# Altium footprint library smd-ipc.PCBLIB: 363 footprints (part 11 of 27)
Each footprint in its own frame and in the unit in brackets; x right, y up, seen from the top. Pads: shape width x height; smd on the part's side, far side on the other; paste and mask are expansions set on the pad; w line width, h text height; cw(c..) or ccw(c..) is an arc to the next point about the centre after c.
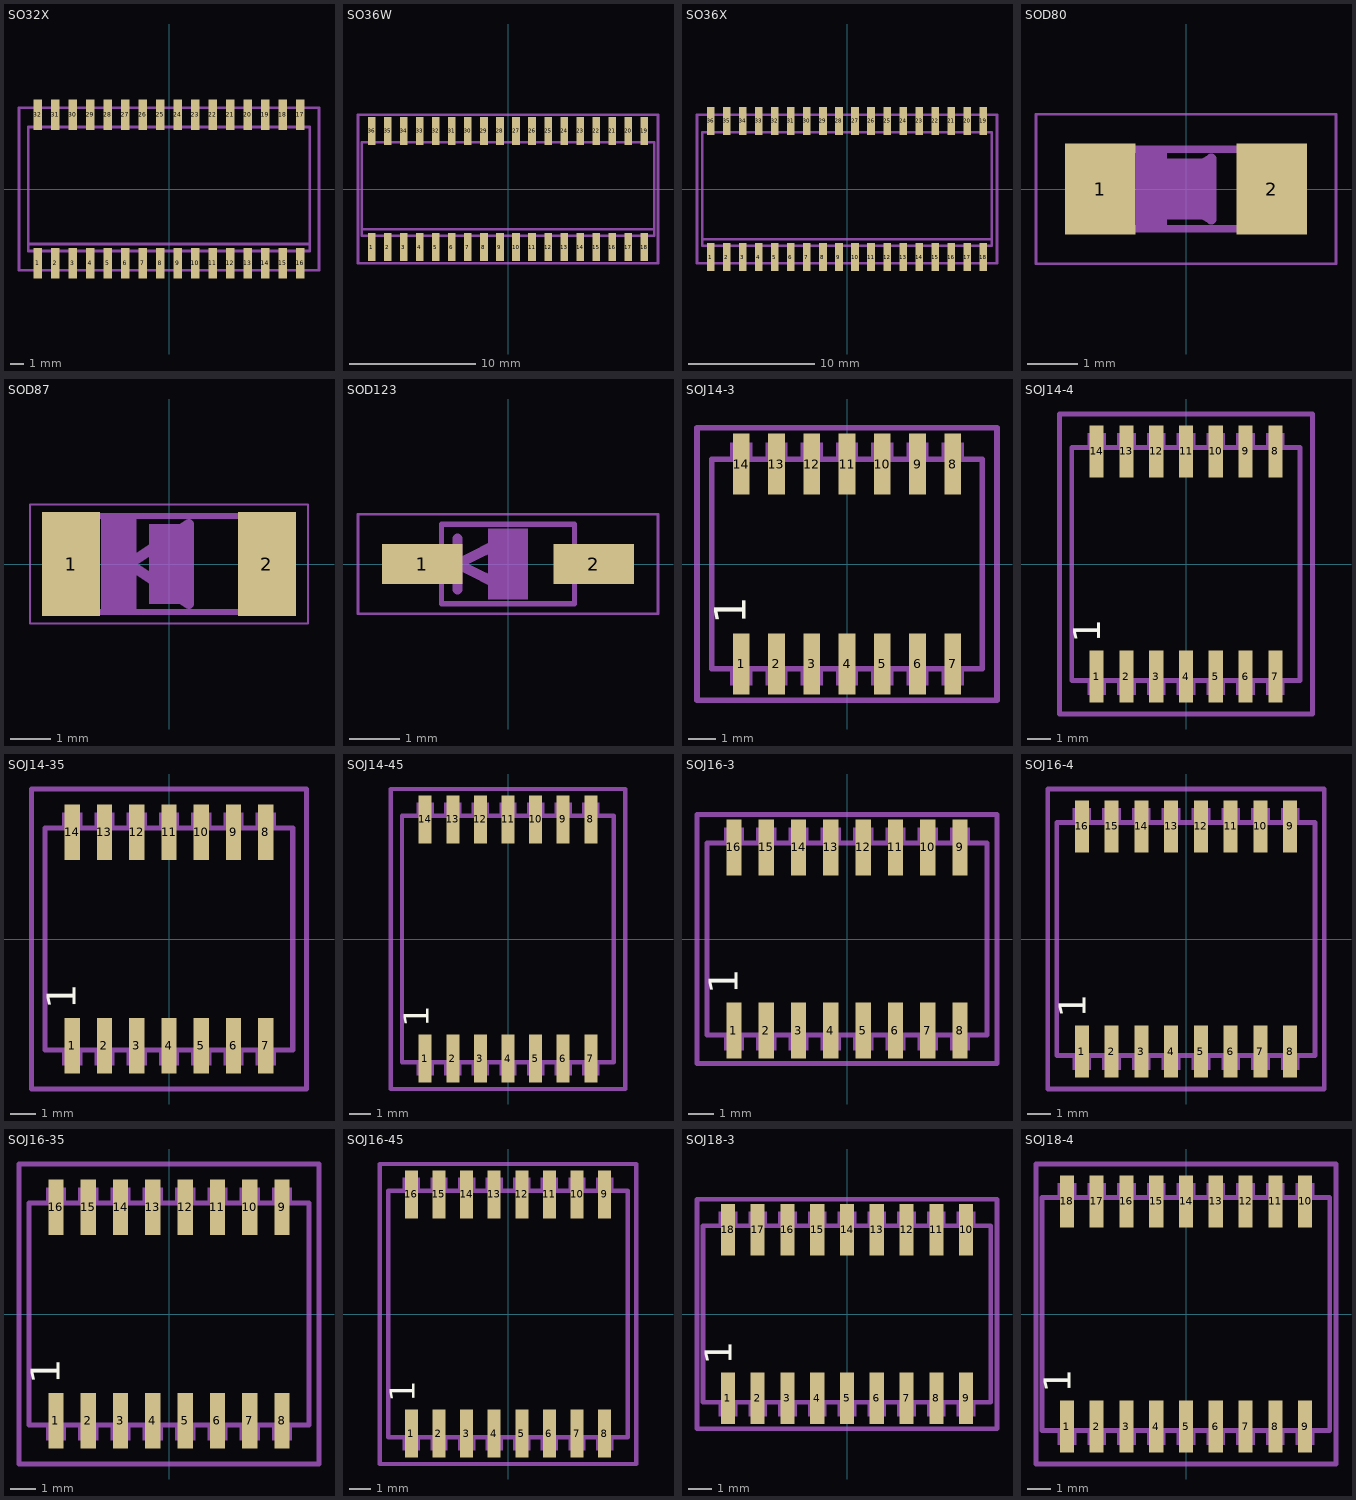
[diagram p10: the footprints below, top view; thin cyan lines are the x and y axes]

## SO32X [mm]
pads (32):
  rect 0.6x2.2 smd: 1(-9.525,-5.4) 2(-8.255,-5.4) 3(-6.985,-5.4) 4(-5.715,-5.4) 5(-4.445,-5.4) 6(-3.175,-5.4) 7(-1.905,-5.4) 8(-0.635,-5.4) 9(0.635,-5.4) 10(1.905,-5.4) 11(3.175,-5.4) 12(4.445,-5.4) 13(5.715,-5.4) 14(6.985,-5.4) 15(8.255,-5.4) 16(9.525,-5.4) 17(9.525,5.4) 18(8.255,5.4) 19(6.985,5.4) 20(5.715,5.4) 21(4.445,5.4) 22(3.175,5.4) 23(1.905,5.4) 24(0.635,5.4) 25(-0.635,5.4) 26(-1.905,5.4) 27(-3.175,5.4) 28(-4.445,5.4) 29(-5.715,5.4) 30(-6.985,5.4) 31(-8.255,5.4) 32(-9.525,5.4)
Mechanical 16:
  rectangle: -9.77,-6.12 -9.28,-4.6
  rectangle: -8.5,-6.12 -8.01,-4.6
  rectangle: -7.23,-6.12 -6.74,-4.6
  rectangle: -5.96,-6.12 -5.47,-4.6
  rectangle: -4.69,-6.12 -4.2,-4.6
  rectangle: -3.42,-6.12 -2.93,-4.6
  rectangle: -2.15,-6.12 -1.66,-4.6
  rectangle: -0.88,-6.12 -0.39,-4.6
  rectangle: 0.39,-6.12 0.88,-4.6
  rectangle: 1.66,-6.12 2.15,-4.6
  rectangle: 2.93,-6.12 3.42,-4.6
  rectangle: 4.2,-6.12 4.69,-4.6
  rectangle: 5.47,-6.12 5.96,-4.6
  rectangle: 6.74,-6.12 7.23,-4.6
  rectangle: 8.01,-6.12 8.5,-4.6
  rectangle: 9.28,-6.12 9.77,-4.6
  rectangle: 9.28,4.6 9.77,6.12
  rectangle: 8.01,4.6 8.5,6.12
  rectangle: 6.74,4.6 7.23,6.12
  rectangle: 5.47,4.6 5.96,6.12
  rectangle: 4.2,4.6 4.69,6.12
  rectangle: 2.93,4.6 3.42,6.12
  rectangle: 1.66,4.6 2.15,6.12
  rectangle: 0.39,4.6 0.88,6.12
  rectangle: -0.88,4.6 -0.39,6.12
  rectangle: -2.15,4.6 -1.66,6.12
  rectangle: -3.42,4.6 -2.93,6.12
  rectangle: -4.69,4.6 -4.2,6.12
  rectangle: -5.96,4.6 -5.47,6.12
  rectangle: -7.23,4.6 -6.74,6.12
  rectangle: -8.5,4.6 -8.01,6.12
  rectangle: -9.77,4.6 -9.28,6.12
  lines w0.203: -10.22,-4 -10.22,-4.5 10.22,-4.5 10.22,-4 ; -10.22,-4 -10.22,4.5 10.22,4.5 10.22,-4 ; -10.22,-4 10.22,-4
Mechanical 27:
  lines w0.2: -10.895,-5.9 10.895,-5.9 10.895,5.9 -10.895,5.9 -10.895,-5.9

## SO36W [mm]
pads (36):
  rect 0.6x2.2 smd: 1(-10.795,-4.6) 2(-9.525,-4.6) 3(-8.255,-4.6) 4(-6.985,-4.6) 5(-5.715,-4.6) 6(-4.445,-4.6) 7(-3.175,-4.6) 8(-1.905,-4.6) 9(-0.635,-4.6) 10(0.635,-4.6) 11(1.905,-4.6) 12(3.175,-4.6) 13(4.445,-4.6) 14(5.715,-4.6) 15(6.985,-4.6) 16(8.255,-4.6) 17(9.525,-4.6) 18(10.795,-4.6) 19(10.795,4.6) 20(9.525,4.6) 21(8.255,4.6) 22(6.985,4.6) 23(5.715,4.6) 24(4.445,4.6) 25(3.175,4.6) 26(1.905,4.6) 27(0.635,4.6) 28(-0.635,4.6) 29(-1.905,4.6) 30(-3.175,4.6) 31(-4.445,4.6) 32(-5.715,4.6) 33(-6.985,4.6) 34(-8.255,4.6) 35(-9.525,4.6) 36(-10.795,4.6)
Mechanical 16:
  rectangle: -11.04,-5.32 -10.55,-3.8
  rectangle: -9.77,-5.32 -9.28,-3.8
  rectangle: -8.5,-5.32 -8.01,-3.8
  rectangle: -7.23,-5.32 -6.74,-3.8
  rectangle: -5.96,-5.32 -5.47,-3.8
  rectangle: -4.69,-5.32 -4.2,-3.8
  rectangle: -3.42,-5.32 -2.93,-3.8
  rectangle: -2.15,-5.32 -1.66,-3.8
  rectangle: -0.88,-5.32 -0.39,-3.8
  rectangle: 0.39,-5.32 0.88,-3.8
  rectangle: 1.66,-5.32 2.15,-3.8
  rectangle: 2.93,-5.32 3.42,-3.8
  rectangle: 4.2,-5.32 4.69,-3.8
  rectangle: 5.47,-5.32 5.96,-3.8
  rectangle: 6.74,-5.32 7.23,-3.8
  rectangle: 8.01,-5.32 8.5,-3.8
  rectangle: 9.28,-5.32 9.77,-3.8
  rectangle: 10.55,-5.32 11.04,-3.8
  rectangle: 10.55,3.8 11.04,5.32
  rectangle: 9.28,3.8 9.77,5.32
  rectangle: 8.01,3.8 8.5,5.32
  rectangle: 6.74,3.8 7.23,5.32
  rectangle: 5.47,3.8 5.96,5.32
  rectangle: 4.2,3.8 4.69,5.32
  rectangle: 2.93,3.8 3.42,5.32
  rectangle: 1.66,3.8 2.15,5.32
  rectangle: 0.39,3.8 0.88,5.32
  rectangle: -0.88,3.8 -0.39,5.32
  rectangle: -2.15,3.8 -1.66,5.32
  rectangle: -3.42,3.8 -2.93,5.32
  rectangle: -4.69,3.8 -4.2,5.32
  rectangle: -5.96,3.8 -5.47,5.32
  rectangle: -7.23,3.8 -6.74,5.32
  rectangle: -8.5,3.8 -8.01,5.32
  rectangle: -9.77,3.8 -9.28,5.32
  rectangle: -11.04,3.8 -10.55,5.32
  lines w0.203: -11.59,-3.2 -11.59,-3.7 11.59,-3.7 11.59,-3.2 ; -11.59,-3.2 -11.59,3.7 11.59,3.7 11.59,-3.2 ; -11.59,-3.2 11.59,-3.2
Mechanical 27:
  lines w0.2: -11.895,-5.9 11.895,-5.9 11.895,5.9 -11.895,5.9 -11.895,-5.9

## SO36X [mm]
pads (36):
  rect 0.6x2.2 smd: 1(-10.795,-5.4) 2(-9.525,-5.4) 3(-8.255,-5.4) 4(-6.985,-5.4) 5(-5.715,-5.4) 6(-4.445,-5.4) 7(-3.175,-5.4) 8(-1.905,-5.4) 9(-0.635,-5.4) 10(0.635,-5.4) 11(1.905,-5.4) 12(3.175,-5.4) 13(4.445,-5.4) 14(5.715,-5.4) 15(6.985,-5.4) 16(8.255,-5.4) 17(9.525,-5.4) 18(10.795,-5.4) 19(10.795,5.4) 20(9.525,5.4) 21(8.255,5.4) 22(6.985,5.4) 23(5.715,5.4) 24(4.445,5.4) 25(3.175,5.4) 26(1.905,5.4) 27(0.635,5.4) 28(-0.635,5.4) 29(-1.905,5.4) 30(-3.175,5.4) 31(-4.445,5.4) 32(-5.715,5.4) 33(-6.985,5.4) 34(-8.255,5.4) 35(-9.525,5.4) 36(-10.795,5.4)
Mechanical 16:
  rectangle: -11.04,-6.12 -10.55,-4.6
  rectangle: -9.77,-6.12 -9.28,-4.6
  rectangle: -8.5,-6.12 -8.01,-4.6
  rectangle: -7.23,-6.12 -6.74,-4.6
  rectangle: -5.96,-6.12 -5.47,-4.6
  rectangle: -4.69,-6.12 -4.2,-4.6
  rectangle: -3.42,-6.12 -2.93,-4.6
  rectangle: -2.15,-6.12 -1.66,-4.6
  rectangle: -0.88,-6.12 -0.39,-4.6
  rectangle: 0.39,-6.12 0.88,-4.6
  rectangle: 1.66,-6.12 2.15,-4.6
  rectangle: 2.93,-6.12 3.42,-4.6
  rectangle: 4.2,-6.12 4.69,-4.6
  rectangle: 5.47,-6.12 5.96,-4.6
  rectangle: 6.74,-6.12 7.23,-4.6
  rectangle: 8.01,-6.12 8.5,-4.6
  rectangle: 9.28,-6.12 9.77,-4.6
  rectangle: 10.55,-6.12 11.04,-4.6
  rectangle: 10.55,4.6 11.04,6.12
  rectangle: 9.28,4.6 9.77,6.12
  rectangle: 8.01,4.6 8.5,6.12
  rectangle: 6.74,4.6 7.23,6.12
  rectangle: 5.47,4.6 5.96,6.12
  rectangle: 4.2,4.6 4.69,6.12
  rectangle: 2.93,4.6 3.42,6.12
  rectangle: 1.66,4.6 2.15,6.12
  rectangle: 0.39,4.6 0.88,6.12
  rectangle: -0.88,4.6 -0.39,6.12
  rectangle: -2.15,4.6 -1.66,6.12
  rectangle: -3.42,4.6 -2.93,6.12
  rectangle: -4.69,4.6 -4.2,6.12
  rectangle: -5.96,4.6 -5.47,6.12
  rectangle: -7.23,4.6 -6.74,6.12
  rectangle: -8.5,4.6 -8.01,6.12
  rectangle: -9.77,4.6 -9.28,6.12
  rectangle: -11.04,4.6 -10.55,6.12
  lines w0.203: -11.49,-4 -11.49,-4.5 11.49,-4.5 11.49,-4 ; -11.49,-4 -11.49,4.5 11.49,4.5 11.49,-4 ; -11.49,-4 11.49,-4
Mechanical 27:
  lines w0.2: -11.895,-5.9 11.895,-5.9 11.895,5.9 -11.895,5.9 -11.895,-5.9

## SOD80 [mm]
pads (2):
  rect 1.4x1.8 smd: 1(-1.7,0) 2(1.7,0)
Mechanical 6:
  rectangle: -0.4,-0.6 0.4,0.6
Mechanical 16:
  rectangle: -1.854,-0.864 -1.295,0.864
  rectangle: 1.295,-0.864 1.854,0.864
  rectangle: -0.991,-0.787 -0.381,0.787
  lines w0.152: -1.321,-0.787 1.321,-0.787 ; -1.321,0.787 1.321,0.787
  lines w0.203: -0.5,0 0.5,0.6 0.5,-0.6 -0.5,0
Mechanical 27:
  lines w0.051: -2.973,-1.483 2.973,-1.483 2.973,1.483 -2.973,1.483 -2.973,-1.483

## SOD87 [mm]
pads (2):
  rect 1.45x2.6 smd: 1(-2.445,0) 2(2.445,0)
Mechanical 6:
  rectangle: -0.5,-1 0.5,1
Mechanical 16:
  rectangle: 2.057,-1.27 2.565,1.27
  rectangle: -2.616,-1.27 -2.108,1.27
  rectangle: -1.702,-1.194 -0.813,1.194
  lines w0.152: -2.159,1.194 2.083,1.194 ; -2.134,-1.194 2.083,-1.194
  lines w0.254: -1,0 0.5,1 0.5,-1 -1,0
Mechanical 27:
  lines w0.051: -3.473,-1.483 3.473,-1.483 3.473,1.483 -3.473,1.483 -3.473,-1.483

## SOD123 [mil]
pads (2):
  rect 62.99x31.5 smd: 1(-66.93,0) 2(66.93,0)
Mechanical 6:
  rectangle: -15.75,-27.56 15.75,27.56
Mechanical 16:
  rectangle: -77,-12 -54,12
  rectangle: 54,-12 77,12
  lines w4: -52.01,-30.98 52.01,-30.98 52.01,30.98 -52.01,30.98 -52.01,-30.98
  lines w8: -39.37,-19.69 -39.37,0 ; -39.37,19.69 -39.37,0 ; -39.37,0 0,19.69 0,-19.69 -39.37,0
Mechanical 27:
  lines w2: -117.05,-38.7 117.05,-38.7 117.05,38.7 -117.05,38.7 -117.05,-38.7

## SOJ14-3 [mm]
pads (14):
  rect 0.6x2.2 smd: 1(-3.81,-3.6) 2(-2.54,-3.6) 3(-1.27,-3.6) 4(0,-3.6) 5(1.27,-3.6) 6(2.54,-3.6) 7(3.81,-3.6) 8(3.81,3.6) 9(2.54,3.6) 10(1.27,3.6) 11(0,3.6) 12(-1.27,3.6) 13(-2.54,3.6) 14(-3.81,3.6)
Top Overlay:
  text "1" at -3.265,-2.17 h1.97
Mechanical 16:
  rectangle: -4.06,-3.67 -3.56,-2.53
  rectangle: -4.21,-4.38 -3.41,-3.87
  rectangle: -2.79,-3.67 -2.29,-2.53
  rectangle: -2.94,-4.38 -2.14,-3.87
  rectangle: -1.52,-3.67 -1.02,-2.53
  rectangle: -1.67,-4.38 -0.87,-3.87
  rectangle: -0.25,-3.67 0.25,-2.53
  rectangle: -0.4,-4.38 0.4,-3.87
  rectangle: 1.02,-3.67 1.52,-2.53
  rectangle: 0.87,-4.38 1.67,-3.87
  rectangle: 2.29,-3.67 2.79,-2.53
  rectangle: 2.14,-4.38 2.94,-3.87
  rectangle: 3.56,-3.67 4.06,-2.53
  rectangle: 3.41,-4.38 4.21,-3.87
  rectangle: 3.56,2.53 4.06,3.67
  rectangle: 3.41,3.87 4.21,4.38
  rectangle: 2.29,2.53 2.79,3.67
  rectangle: 2.14,3.87 2.94,4.38
  rectangle: 1.02,2.53 1.52,3.67
  rectangle: 0.87,3.87 1.67,4.38
  rectangle: -0.25,2.53 0.25,3.67
  rectangle: -0.4,3.87 0.4,4.38
  rectangle: -1.52,2.53 -1.02,3.67
  rectangle: -1.67,3.87 -0.87,4.38
  rectangle: -2.79,2.53 -2.29,3.67
  rectangle: -2.94,3.87 -2.14,4.38
  rectangle: -4.06,2.53 -3.56,3.67
  rectangle: -4.21,3.87 -3.41,4.38
  lines w0.203: -4.875,-3.77 4.865,-3.77 4.865,3.77 -4.875,3.77 -4.875,-3.77
Mechanical 27:
  lines w0.2: -5.4,-4.9 -5.4,4.9 5.4,4.9 5.4,-4.9 -5.4,-4.9

## SOJ14-4 [mm]
pads (14):
  rect 0.6x2.2 smd: 1(-3.81,-4.8) 2(-2.54,-4.8) 3(-1.27,-4.8) 4(0,-4.8) 5(1.27,-4.8) 6(2.54,-4.8) 7(3.81,-4.8) 8(3.81,4.8) 9(2.54,4.8) 10(1.27,4.8) 11(0,4.8) 12(-1.27,4.8) 13(-2.54,4.8) 14(-3.81,4.8)
Top Overlay:
  text "1" at -3.265,-3.37 h1.97
Mechanical 16:
  rectangle: -4.06,-4.87 -3.56,-3.73
  rectangle: -4.21,-5.58 -3.41,-5.07
  rectangle: -2.79,-4.87 -2.29,-3.73
  rectangle: -2.94,-5.58 -2.14,-5.07
  rectangle: -1.52,-4.87 -1.02,-3.73
  rectangle: -1.67,-5.58 -0.87,-5.07
  rectangle: -0.25,-4.87 0.25,-3.73
  rectangle: -0.4,-5.58 0.4,-5.07
  rectangle: 1.02,-4.87 1.52,-3.73
  rectangle: 0.87,-5.58 1.67,-5.07
  rectangle: 2.29,-4.87 2.79,-3.73
  rectangle: 2.14,-5.58 2.94,-5.07
  rectangle: 3.56,-4.87 4.06,-3.73
  rectangle: 3.41,-5.58 4.21,-5.07
  rectangle: 3.56,3.73 4.06,4.87
  rectangle: 3.41,5.07 4.21,5.58
  rectangle: 2.29,3.73 2.79,4.87
  rectangle: 2.14,5.07 2.94,5.58
  rectangle: 1.02,3.73 1.52,4.87
  rectangle: 0.87,5.07 1.67,5.58
  rectangle: -0.25,3.73 0.25,4.87
  rectangle: -0.4,5.07 0.4,5.58
  rectangle: -1.52,3.73 -1.02,4.87
  rectangle: -1.67,5.07 -0.87,5.58
  rectangle: -2.79,3.73 -2.29,4.87
  rectangle: -2.94,5.07 -2.14,5.58
  rectangle: -4.06,3.73 -3.56,4.87
  rectangle: -4.21,5.07 -3.41,5.58
  lines w0.203: -4.875,-4.97 4.865,-4.97 4.865,4.97 -4.875,4.97 -4.875,-4.97
Mechanical 27:
  lines w0.2: -5.4,-6.4 -5.4,6.4 5.4,6.4 5.4,-6.4 -5.4,-6.4

## SOJ14-35 [mm]
pads (14):
  rect 0.6x2.2 smd: 1(-3.81,-4.2) 2(-2.54,-4.2) 3(-1.27,-4.2) 4(0,-4.2) 5(1.27,-4.2) 6(2.54,-4.2) 7(3.81,-4.2) 8(3.81,4.2) 9(2.54,4.2) 10(1.27,4.2) 11(0,4.2) 12(-1.27,4.2) 13(-2.54,4.2) 14(-3.81,4.2)
Top Overlay:
  text "1" at -3.265,-2.77 h1.97
Mechanical 16:
  rectangle: -4.06,-4.27 -3.56,-3.13
  rectangle: -4.21,-4.98 -3.41,-4.47
  rectangle: -2.79,-4.27 -2.29,-3.13
  rectangle: -2.94,-4.98 -2.14,-4.47
  rectangle: -1.52,-4.27 -1.02,-3.13
  rectangle: -1.67,-4.98 -0.87,-4.47
  rectangle: -0.25,-4.27 0.25,-3.13
  rectangle: -0.4,-4.98 0.4,-4.47
  rectangle: 1.02,-4.27 1.52,-3.13
  rectangle: 0.87,-4.98 1.67,-4.47
  rectangle: 2.29,-4.27 2.79,-3.13
  rectangle: 2.14,-4.98 2.94,-4.47
  rectangle: 3.56,-4.27 4.06,-3.13
  rectangle: 3.41,-4.98 4.21,-4.47
  rectangle: 3.56,3.13 4.06,4.27
  rectangle: 3.41,4.47 4.21,4.98
  rectangle: 2.29,3.13 2.79,4.27
  rectangle: 2.14,4.47 2.94,4.98
  rectangle: 1.02,3.13 1.52,4.27
  rectangle: 0.87,4.47 1.67,4.98
  rectangle: -0.25,3.13 0.25,4.27
  rectangle: -0.4,4.47 0.4,4.98
  rectangle: -1.52,3.13 -1.02,4.27
  rectangle: -1.67,4.47 -0.87,4.98
  rectangle: -2.79,3.13 -2.29,4.27
  rectangle: -2.94,4.47 -2.14,4.98
  rectangle: -4.06,3.13 -3.56,4.27
  rectangle: -4.21,4.47 -3.41,4.98
  lines w0.203: -4.875,-4.37 4.865,-4.37 4.865,4.37 -4.875,4.37 -4.875,-4.37
Mechanical 27:
  lines w0.2: -5.4,-5.9 -5.4,5.9 5.4,5.9 5.4,-5.9 -5.4,-5.9

## SOJ14-45 [mm]
pads (14):
  rect 0.6x2.2 smd: 1(-3.81,-5.5) 2(-2.54,-5.5) 3(-1.27,-5.5) 4(0,-5.5) 5(1.27,-5.5) 6(2.54,-5.5) 7(3.81,-5.5) 8(3.81,5.5) 9(2.54,5.5) 10(1.27,5.5) 11(0,5.5) 12(-1.27,5.5) 13(-2.54,5.5) 14(-3.81,5.5)
Top Overlay:
  text "1" at -3.265,-4.07 h1.97
Mechanical 16:
  rectangle: -4.06,-5.57 -3.56,-4.43
  rectangle: -4.21,-6.28 -3.41,-5.77
  rectangle: -2.79,-5.57 -2.29,-4.43
  rectangle: -2.94,-6.28 -2.14,-5.77
  rectangle: -1.52,-5.57 -1.02,-4.43
  rectangle: -1.67,-6.28 -0.87,-5.77
  rectangle: -0.25,-5.57 0.25,-4.43
  rectangle: -0.4,-6.28 0.4,-5.77
  rectangle: 1.02,-5.57 1.52,-4.43
  rectangle: 0.87,-6.28 1.67,-5.77
  rectangle: 2.29,-5.57 2.79,-4.43
  rectangle: 2.14,-6.28 2.94,-5.77
  rectangle: 3.56,-5.57 4.06,-4.43
  rectangle: 3.41,-6.28 4.21,-5.77
  rectangle: 3.56,4.43 4.06,5.57
  rectangle: 3.41,5.77 4.21,6.28
  rectangle: 2.29,4.43 2.79,5.57
  rectangle: 2.14,5.77 2.94,6.28
  rectangle: 1.02,4.43 1.52,5.57
  rectangle: 0.87,5.77 1.67,6.28
  rectangle: -0.25,4.43 0.25,5.57
  rectangle: -0.4,5.77 0.4,6.28
  rectangle: -1.52,4.43 -1.02,5.57
  rectangle: -1.67,5.77 -0.87,6.28
  rectangle: -2.79,4.43 -2.29,5.57
  rectangle: -2.94,5.77 -2.14,6.28
  rectangle: -4.06,4.43 -3.56,5.57
  rectangle: -4.21,5.77 -3.41,6.28
  lines w0.203: -4.875,-5.67 4.865,-5.67 4.865,5.67 -4.875,5.67 -4.875,-5.67
Mechanical 27:
  lines w0.2: -5.4,-6.9 -5.4,6.9 5.4,6.9 5.4,-6.9 -5.4,-6.9

## SOJ16-3 [mm]
pads (16):
  rect 0.6x2.2 smd: 1(-4.445,-3.6) 2(-3.175,-3.6) 3(-1.905,-3.6) 4(-0.635,-3.6) 5(0.635,-3.6) 6(1.905,-3.6) 7(3.175,-3.6) 8(4.445,-3.6) 9(4.445,3.6) 10(3.175,3.6) 11(1.905,3.6) 12(0.635,3.6) 13(-0.635,3.6) 14(-1.905,3.6) 15(-3.175,3.6) 16(-4.445,3.6)
Top Overlay:
  text "1" at -3.9,-2.17 h1.97
Mechanical 16:
  rectangle: -4.695,-3.67 -4.195,-2.53
  rectangle: -4.845,-4.38 -4.045,-3.87
  rectangle: -3.425,-3.67 -2.925,-2.53
  rectangle: -3.575,-4.38 -2.775,-3.87
  rectangle: -2.155,-3.67 -1.655,-2.53
  rectangle: -2.305,-4.38 -1.505,-3.87
  rectangle: -0.885,-3.67 -0.385,-2.53
  rectangle: -1.035,-4.38 -0.235,-3.87
  rectangle: 0.385,-3.67 0.885,-2.53
  rectangle: 0.235,-4.38 1.035,-3.87
  rectangle: 1.655,-3.67 2.155,-2.53
  rectangle: 1.505,-4.38 2.305,-3.87
  rectangle: 2.925,-3.67 3.425,-2.53
  rectangle: 2.775,-4.38 3.575,-3.87
  rectangle: 4.195,-3.67 4.695,-2.53
  rectangle: 4.045,-4.38 4.845,-3.87
  rectangle: 4.195,2.53 4.695,3.67
  rectangle: 4.045,3.87 4.845,4.38
  rectangle: 2.925,2.53 3.425,3.67
  rectangle: 2.775,3.87 3.575,4.38
  rectangle: 1.655,2.53 2.155,3.67
  rectangle: 1.505,3.87 2.305,4.38
  rectangle: 0.385,2.53 0.885,3.67
  rectangle: 0.235,3.87 1.035,4.38
  rectangle: -0.885,2.53 -0.385,3.67
  rectangle: -1.035,3.87 -0.235,4.38
  rectangle: -2.155,2.53 -1.655,3.67
  rectangle: -2.305,3.87 -1.505,4.38
  rectangle: -3.425,2.53 -2.925,3.67
  rectangle: -3.575,3.87 -2.775,4.38
  rectangle: -4.695,2.53 -4.195,3.67
  rectangle: -4.845,3.87 -4.045,4.38
  lines w0.203: -5.51,-3.77 5.5,-3.77 5.5,3.77 -5.51,3.77 -5.51,-3.77
Mechanical 27:
  lines w0.2: -5.9,-4.9 -5.9,4.9 5.9,4.9 5.9,-4.9 -5.9,-4.9

## SOJ16-4 [mm]
pads (16):
  rect 0.6x2.2 smd: 1(-4.445,-4.8) 2(-3.175,-4.8) 3(-1.905,-4.8) 4(-0.635,-4.8) 5(0.635,-4.8) 6(1.905,-4.8) 7(3.175,-4.8) 8(4.445,-4.8) 9(4.445,4.8) 10(3.175,4.8) 11(1.905,4.8) 12(0.635,4.8) 13(-0.635,4.8) 14(-1.905,4.8) 15(-3.175,4.8) 16(-4.445,4.8)
Top Overlay:
  text "1" at -3.9,-3.37 h1.97
Mechanical 16:
  rectangle: -4.695,-4.87 -4.195,-3.73
  rectangle: -4.845,-5.58 -4.045,-5.07
  rectangle: -3.425,-4.87 -2.925,-3.73
  rectangle: -3.575,-5.58 -2.775,-5.07
  rectangle: -2.155,-4.87 -1.655,-3.73
  rectangle: -2.305,-5.58 -1.505,-5.07
  rectangle: -0.885,-4.87 -0.385,-3.73
  rectangle: -1.035,-5.58 -0.235,-5.07
  rectangle: 0.385,-4.87 0.885,-3.73
  rectangle: 0.235,-5.58 1.035,-5.07
  rectangle: 1.655,-4.87 2.155,-3.73
  rectangle: 1.505,-5.58 2.305,-5.07
  rectangle: 2.925,-4.87 3.425,-3.73
  rectangle: 2.775,-5.58 3.575,-5.07
  rectangle: 4.195,-4.87 4.695,-3.73
  rectangle: 4.045,-5.58 4.845,-5.07
  rectangle: 4.195,3.73 4.695,4.87
  rectangle: 4.045,5.07 4.845,5.58
  rectangle: 2.925,3.73 3.425,4.87
  rectangle: 2.775,5.07 3.575,5.58
  rectangle: 1.655,3.73 2.155,4.87
  rectangle: 1.505,5.07 2.305,5.58
  rectangle: 0.385,3.73 0.885,4.87
  rectangle: 0.235,5.07 1.035,5.58
  rectangle: -0.885,3.73 -0.385,4.87
  rectangle: -1.035,5.07 -0.235,5.58
  rectangle: -2.155,3.73 -1.655,4.87
  rectangle: -2.305,5.07 -1.505,5.58
  rectangle: -3.425,3.73 -2.925,4.87
  rectangle: -3.575,5.07 -2.775,5.58
  rectangle: -4.695,3.73 -4.195,4.87
  rectangle: -4.845,5.07 -4.045,5.58
  lines w0.203: -5.51,-4.97 5.5,-4.97 5.5,4.97 -5.51,4.97 -5.51,-4.97
Mechanical 27:
  lines w0.2: -5.9,-6.4 -5.9,6.4 5.9,6.4 5.9,-6.4 -5.9,-6.4

## SOJ16-35 [mm]
pads (16):
  rect 0.6x2.2 smd: 1(-4.445,-4.2) 2(-3.175,-4.2) 3(-1.905,-4.2) 4(-0.635,-4.2) 5(0.635,-4.2) 6(1.905,-4.2) 7(3.175,-4.2) 8(4.445,-4.2) 9(4.445,4.2) 10(3.175,4.2) 11(1.905,4.2) 12(0.635,4.2) 13(-0.635,4.2) 14(-1.905,4.2) 15(-3.175,4.2) 16(-4.445,4.2)
Top Overlay:
  text "1" at -3.9,-2.77 h1.97
Mechanical 16:
  rectangle: -4.695,-4.27 -4.195,-3.13
  rectangle: -4.845,-4.98 -4.045,-4.47
  rectangle: -3.425,-4.27 -2.925,-3.13
  rectangle: -3.575,-4.98 -2.775,-4.47
  rectangle: -2.155,-4.27 -1.655,-3.13
  rectangle: -2.305,-4.98 -1.505,-4.47
  rectangle: -0.885,-4.27 -0.385,-3.13
  rectangle: -1.035,-4.98 -0.235,-4.47
  rectangle: 0.385,-4.27 0.885,-3.13
  rectangle: 0.235,-4.98 1.035,-4.47
  rectangle: 1.655,-4.27 2.155,-3.13
  rectangle: 1.505,-4.98 2.305,-4.47
  rectangle: 2.925,-4.27 3.425,-3.13
  rectangle: 2.775,-4.98 3.575,-4.47
  rectangle: 4.195,-4.27 4.695,-3.13
  rectangle: 4.045,-4.98 4.845,-4.47
  rectangle: 4.195,3.13 4.695,4.27
  rectangle: 4.045,4.47 4.845,4.98
  rectangle: 2.925,3.13 3.425,4.27
  rectangle: 2.775,4.47 3.575,4.98
  rectangle: 1.655,3.13 2.155,4.27
  rectangle: 1.505,4.47 2.305,4.98
  rectangle: 0.385,3.13 0.885,4.27
  rectangle: 0.235,4.47 1.035,4.98
  rectangle: -0.885,3.13 -0.385,4.27
  rectangle: -1.035,4.47 -0.235,4.98
  rectangle: -2.155,3.13 -1.655,4.27
  rectangle: -2.305,4.47 -1.505,4.98
  rectangle: -3.425,3.13 -2.925,4.27
  rectangle: -3.575,4.47 -2.775,4.98
  rectangle: -4.695,3.13 -4.195,4.27
  rectangle: -4.845,4.47 -4.045,4.98
  lines w0.203: -5.51,-4.37 5.5,-4.37 5.5,4.37 -5.51,4.37 -5.51,-4.37
Mechanical 27:
  lines w0.2: -5.9,-5.9 -5.9,5.9 5.9,5.9 5.9,-5.9 -5.9,-5.9

## SOJ16-45 [mm]
pads (16):
  rect 0.6x2.2 smd: 1(-4.445,-5.5) 2(-3.175,-5.5) 3(-1.905,-5.5) 4(-0.635,-5.5) 5(0.635,-5.5) 6(1.905,-5.5) 7(3.175,-5.5) 8(4.445,-5.5) 9(4.445,5.5) 10(3.175,5.5) 11(1.905,5.5) 12(0.635,5.5) 13(-0.635,5.5) 14(-1.905,5.5) 15(-3.175,5.5) 16(-4.445,5.5)
Top Overlay:
  text "1" at -3.9,-4.07 h1.97
Mechanical 16:
  rectangle: -4.695,-5.57 -4.195,-4.43
  rectangle: -4.845,-6.28 -4.045,-5.77
  rectangle: -3.425,-5.57 -2.925,-4.43
  rectangle: -3.575,-6.28 -2.775,-5.77
  rectangle: -2.155,-5.57 -1.655,-4.43
  rectangle: -2.305,-6.28 -1.505,-5.77
  rectangle: -0.885,-5.57 -0.385,-4.43
  rectangle: -1.035,-6.28 -0.235,-5.77
  rectangle: 0.385,-5.57 0.885,-4.43
  rectangle: 0.235,-6.28 1.035,-5.77
  rectangle: 1.655,-5.57 2.155,-4.43
  rectangle: 1.505,-6.28 2.305,-5.77
  rectangle: 2.925,-5.57 3.425,-4.43
  rectangle: 2.775,-6.28 3.575,-5.77
  rectangle: 4.195,-5.57 4.695,-4.43
  rectangle: 4.045,-6.28 4.845,-5.77
  rectangle: 4.195,4.43 4.695,5.57
  rectangle: 4.045,5.77 4.845,6.28
  rectangle: 2.925,4.43 3.425,5.57
  rectangle: 2.775,5.77 3.575,6.28
  rectangle: 1.655,4.43 2.155,5.57
  rectangle: 1.505,5.77 2.305,6.28
  rectangle: 0.385,4.43 0.885,5.57
  rectangle: 0.235,5.77 1.035,6.28
  rectangle: -0.885,4.43 -0.385,5.57
  rectangle: -1.035,5.77 -0.235,6.28
  rectangle: -2.155,4.43 -1.655,5.57
  rectangle: -2.305,5.77 -1.505,6.28
  rectangle: -3.425,4.43 -2.925,5.57
  rectangle: -3.575,5.77 -2.775,6.28
  rectangle: -4.695,4.43 -4.195,5.57
  rectangle: -4.845,5.77 -4.045,6.28
  lines w0.203: -5.51,-5.67 5.5,-5.67 5.5,5.67 -5.51,5.67 -5.51,-5.67
Mechanical 27:
  lines w0.2: -5.9,-6.9 -5.9,6.9 5.9,6.9 5.9,-6.9 -5.9,-6.9

## SOJ18-3 [mm]
pads (18):
  rect 0.6x2.2 smd: 1(-5.08,-3.6) 2(-3.81,-3.6) 3(-2.54,-3.6) 4(-1.27,-3.6) 5(0,-3.6) 6(1.27,-3.6) 7(2.54,-3.6) 8(3.81,-3.6) 9(5.08,-3.6) 10(5.08,3.6) 11(3.81,3.6) 12(2.54,3.6) 13(1.27,3.6) 14(0,3.6) 15(-1.27,3.6) 16(-2.54,3.6) 17(-3.81,3.6) 18(-5.08,3.6)
Top Overlay:
  text "1" at -4.535,-2.17 h1.97
Mechanical 16:
  rectangle: -5.33,-3.67 -4.83,-2.53
  rectangle: -5.48,-4.38 -4.68,-3.87
  rectangle: -4.06,-3.67 -3.56,-2.53
  rectangle: -4.21,-4.38 -3.41,-3.87
  rectangle: -2.79,-3.67 -2.29,-2.53
  rectangle: -2.94,-4.38 -2.14,-3.87
  rectangle: -1.52,-3.67 -1.02,-2.53
  rectangle: -1.67,-4.38 -0.87,-3.87
  rectangle: -0.25,-3.67 0.25,-2.53
  rectangle: -0.4,-4.38 0.4,-3.87
  rectangle: 1.02,-3.67 1.52,-2.53
  rectangle: 0.87,-4.38 1.67,-3.87
  rectangle: 2.29,-3.67 2.79,-2.53
  rectangle: 2.14,-4.38 2.94,-3.87
  rectangle: 3.56,-3.67 4.06,-2.53
  rectangle: 3.41,-4.38 4.21,-3.87
  rectangle: 4.83,-3.67 5.33,-2.53
  rectangle: 4.68,-4.38 5.48,-3.87
  rectangle: 4.83,2.53 5.33,3.67
  rectangle: 4.68,3.87 5.48,4.38
  rectangle: 3.56,2.53 4.06,3.67
  rectangle: 3.41,3.87 4.21,4.38
  rectangle: 2.29,2.53 2.79,3.67
  rectangle: 2.14,3.87 2.94,4.38
  rectangle: 1.02,2.53 1.52,3.67
  rectangle: 0.87,3.87 1.67,4.38
  rectangle: -0.25,2.53 0.25,3.67
  rectangle: -0.4,3.87 0.4,4.38
  rectangle: -1.52,2.53 -1.02,3.67
  rectangle: -1.67,3.87 -0.87,4.38
  rectangle: -2.79,2.53 -2.29,3.67
  rectangle: -2.94,3.87 -2.14,4.38
  rectangle: -4.06,2.53 -3.56,3.67
  rectangle: -4.21,3.87 -3.41,4.38
  rectangle: -5.33,2.53 -4.83,3.67
  rectangle: -5.48,3.87 -4.68,4.38
  lines w0.203: -6.145,-3.77 6.135,-3.77 6.135,3.77 -6.145,3.77 -6.145,-3.77
Mechanical 27:
  lines w0.2: -6.4,-4.9 -6.4,4.9 6.4,4.9 6.4,-4.9 -6.4,-4.9

## SOJ18-4 [mm]
pads (18):
  rect 0.6x2.2 smd: 1(-5.08,-4.8) 2(-3.81,-4.8) 3(-2.54,-4.8) 4(-1.27,-4.8) 5(0,-4.8) 6(1.27,-4.8) 7(2.54,-4.8) 8(3.81,-4.8) 9(5.08,-4.8) 10(5.08,4.8) 11(3.81,4.8) 12(2.54,4.8) 13(1.27,4.8) 14(0,4.8) 15(-1.27,4.8) 16(-2.54,4.8) 17(-3.81,4.8) 18(-5.08,4.8)
Top Overlay:
  text "1" at -4.535,-3.37 h1.97
Mechanical 16:
  rectangle: -5.33,-4.87 -4.83,-3.73
  rectangle: -5.48,-5.58 -4.68,-5.07
  rectangle: -4.06,-4.87 -3.56,-3.73
  rectangle: -4.21,-5.58 -3.41,-5.07
  rectangle: -2.79,-4.87 -2.29,-3.73
  rectangle: -2.94,-5.58 -2.14,-5.07
  rectangle: -1.52,-4.87 -1.02,-3.73
  rectangle: -1.67,-5.58 -0.87,-5.07
  rectangle: -0.25,-4.87 0.25,-3.73
  rectangle: -0.4,-5.58 0.4,-5.07
  rectangle: 1.02,-4.87 1.52,-3.73
  rectangle: 0.87,-5.58 1.67,-5.07
  rectangle: 2.29,-4.87 2.79,-3.73
  rectangle: 2.14,-5.58 2.94,-5.07
  rectangle: 3.56,-4.87 4.06,-3.73
  rectangle: 3.41,-5.58 4.21,-5.07
  rectangle: 4.83,-4.87 5.33,-3.73
  rectangle: 4.68,-5.58 5.48,-5.07
  rectangle: 4.83,3.73 5.33,4.87
  rectangle: 4.68,5.07 5.48,5.58
  rectangle: 3.56,3.73 4.06,4.87
  rectangle: 3.41,5.07 4.21,5.58
  rectangle: 2.29,3.73 2.79,4.87
  rectangle: 2.14,5.07 2.94,5.58
  rectangle: 1.02,3.73 1.52,4.87
  rectangle: 0.87,5.07 1.67,5.58
  rectangle: -0.25,3.73 0.25,4.87
  rectangle: -0.4,5.07 0.4,5.58
  rectangle: -1.52,3.73 -1.02,4.87
  rectangle: -1.67,5.07 -0.87,5.58
  rectangle: -2.79,3.73 -2.29,4.87
  rectangle: -2.94,5.07 -2.14,5.58
  rectangle: -4.06,3.73 -3.56,4.87
  rectangle: -4.21,5.07 -3.41,5.58
  rectangle: -5.33,3.73 -4.83,4.87
  rectangle: -5.48,5.07 -4.68,5.58
  lines w0.203: -6.145,-4.97 6.135,-4.97 6.135,4.97 -6.145,4.97 -6.145,-4.97
Mechanical 27:
  lines w0.2: -6.4,-6.4 -6.4,6.4 6.4,6.4 6.4,-6.4 -6.4,-6.4